# Altium footprint library Footprints.PcbLib: 17 footprints (part 2 of 2)
Each footprint in its own frame and in the unit in brackets; x right, y up, seen from the top. Pads: shape width x height; smd on the part's side, far side on the other; paste and mask are expansions set on the pad; w line width, h text height; cw(c..) or ccw(c..) is an arc to the next point about the centre after c.
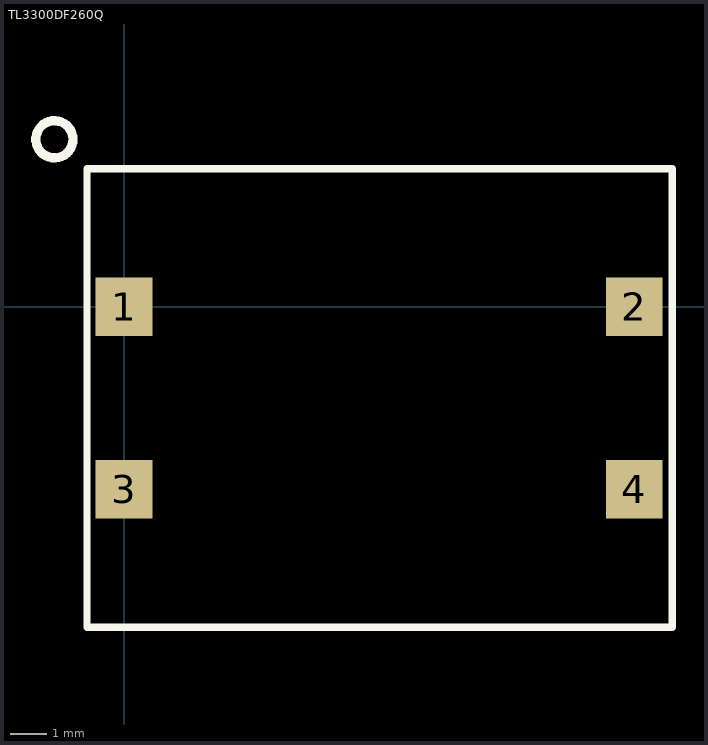
[diagram p1: the footprint, top view; thin cyan lines are the x and y axes]

## TL3300DF260Q [mm] "SWITCH TACTILE SPST-NO 0.05A 12V"
height 4.293
pads (4):
  rect 1.55x1.6 smd: 1(0,0) 2(13.95,0) 3(0,-5) 4(13.95,-5)
Top Overlay:
  circle w0.254: c-1.905,4.572 r0.508
  lines w0.2: -1.016,-8.77 14.986,-8.77 14.986,3.77 -1.016,3.77 -1.016,-8.77
3D body "TL3300DFxxxQ.stp": height 4.3, standoff -0.3, extent -0.515,-8.509 14.485,3.491